# Altium footprint library PcbLib1.PcbLib: 212 footprints (part 8 of 14)
Each footprint in its own frame and in the unit in brackets; x right, y up, seen from the top. Pads: shape width x height; smd on the part's side, far side on the other; paste and mask are expansions set on the pad; w line width, h text height; cw(c..) or ccw(c..) is an arc to the next point about the centre after c.
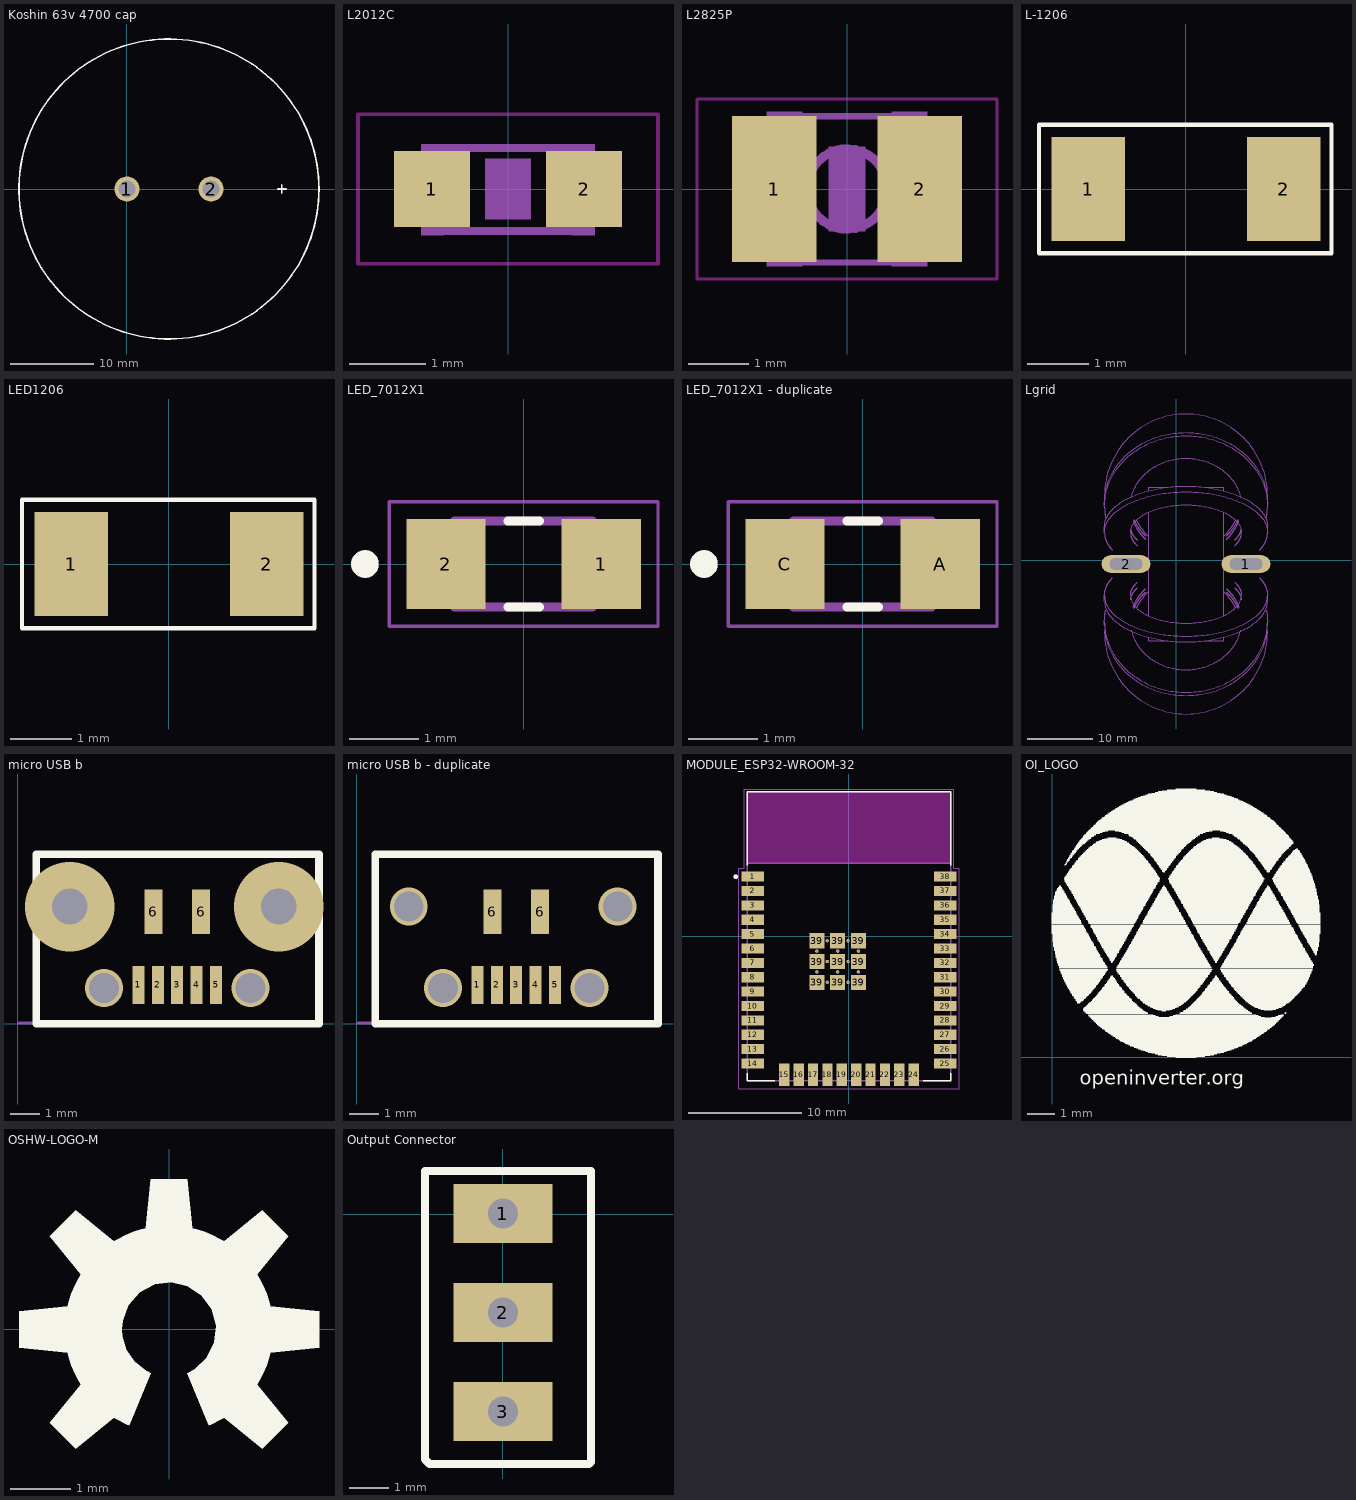
[diagram p7: the footprints below, top view; thin cyan lines are the x and y axes]

## Koshin 63v 4700 cap [mm]
pads (2):
  round 3 hole 2: 1(0,0) 2(10.1,0)
Top Overlay:
  circle w0.2: c5.05,0 r18
  lines w0.2: 18.082,0 19.098,0 ; 18.59,-0.508 18.59,0.508
3D body "Snap-Cap 35mm W x 50mm H 10mm pitch.step": height 50, standoff -6.2, extent -12.571,-17.421 22.425,17.575

## L2012C [mm] "L2012C"
pads (2):
  rect 1x1 smd: 1(-1,0) 2(1,0)
Top Layer keep-out:
  lines w0.051: -1.973,-0.983 -1.973,0.983 1.973,0.983 1.973,-0.983 -1.973,-0.983
Bottom Assembly:
  region: 0.838,-0.61 0.838,0.59 1.138,0.59 1.138,-0.61
  region: -1.143,-0.61 -1.143,0.59 -0.843,0.59 -0.843,-0.61
  lines w0.102: -0.864,-0.553 0.864,-0.553 ; -0.864,0.54 0.864,0.54
Top Glue Points:
  region: -0.3,-0.4 -0.3,0.4 0.3,0.4 0.3,-0.4

## L2825P [mm] "L2825P"
pads (2):
  rect 1.4x2.4 smd: 1(-1.2,0) 2(1.2,0)
Top Layer keep-out:
  lines w0.051: -2.473,-1.483 -2.473,1.483 2.473,1.483 2.473,-1.483 -2.473,-1.483
Bottom Assembly:
  circle w0.152: c0,0 r0.66
  region: -1.321,-1.27 -1.321,1.27 -0.737,1.27 -0.737,-1.27
  region: 0.737,-1.27 0.737,1.27 1.321,1.27 1.321,-1.27
  lines w0.102: -1.34,-0.965 -1.34,0.965 ; -0.762,-1.213 0.762,-1.213 ; -0.762,1.2 0.762,1.2 ; 1.34,-0.965 1.34,0.965
Top Glue Points:
  region: -0.3,-0.7 -0.3,0.7 0.3,0.7 0.3,-0.7

## L-1206 [mm]
pads (2):
  rect 1.2x1.7 smd: 1(-1.6,0) 2(1.6,0)
Top Overlay:
  lines w0.07: -2.4,-1.05 2.375,-1.05 2.375,-0.531 2.375,0.556 2.375,0.692 2.375,1.05 -2.4,1.05 -2.4,-1.05
3D body "SML-LXLC1206.stp": height 1.11, standoff 0, extent -1.73,-0.8 1.476,0.8

## LED1206 [mm]
pads (2):
  rect 1.2x1.7 smd: 1(-1.6,0) 2(1.6,0)
Top Overlay:
  lines w0.07: -2.4,-1.05 -2.4,1.05 2.375,1.05 2.375,0.692 2.375,0.556 2.375,-0.531 2.375,-1.05 -2.4,-1.05
3D body "SML-LXLC1206.stp": height 1.11, standoff 0, extent -1.73,-0.8 1.476,0.8

## LED_7012X1 [mm]
pads (2):
  rect 1.15x1.3 smd: 1(1.125,0) 2(-1.125,0)
Top Overlay:
  circle w0.2: c-2.3,0 r0.1
  lines w0.127: -0.23,-0.625 0.23,-0.625 ; -0.23,0.625 0.23,0.625
Mechanical 13:
  circle w0.2: c-2.3,0 r0.1
  lines w0.127: -1,-0.625 -1,0.625 1,0.625 1,-0.625 -1,-0.625
Mechanical 15:
  lines w0.05: -1.95,-0.9 -1.95,0.9 1.95,0.9 1.95,-0.9 -1.95,-0.9
3D body "7012X1--3DModel-STEP-1.STEP": height 0.73, standoff 0, extent -1.003,-0.622 1.003,0.622

## LED_7012X1 - duplicate [mm]
pads (2):
  rect 1.15x1.3 smd: A(1.125,0) C(-1.125,0)
Top Overlay:
  circle w0.2: c-2.3,0 r0.1
  lines w0.127: -0.23,-0.625 0.23,-0.625 ; -0.23,0.625 0.23,0.625
Mechanical 13:
  circle w0.2: c-2.3,0 r0.1
  lines w0.127: -1,-0.625 1,-0.625 1,0.625 -1,0.625 -1,-0.625
Mechanical 15:
  lines w0.05: -1.95,-0.9 1.95,-0.9 1.95,0.9 -1.95,0.9 -1.95,-0.9
3D body "7012X1--3DModel-STEP-1.STEP": height 0.73, standoff 0, extent -1.003,-0.622 1.003,0.622

## Lgrid [mm]
pads (2):
  oval 7.5x2.7 hole 1.8 slot 5 at 0 deg: 1(10.687,-0.59) 2(-7.713,-0.59)
Bottom Assembly:
  drawing of 3628 lines, arcs and shapes, not listed
3D body "750343811.stp": height 48.01, standoff 0.01, extent -11.28,-23.59 13.72,22.41

## micro USB b [mm]
pads (7):
  rect 0.4x1.27 smd: 1(4.05,1.3) 2(4.7,1.3) 3(5.35,1.3) 4(6,1.3) 5(6.65,1.3)
  rect 0.6x1.5 smd: 6(4.55,3.75) 6(6.15,3.75)
via 8.75,3.925 diameter 3 hole 1.2
via 1.75,3.925 diameter 3 hole 1.2
via 7.8,1.2 diameter 1.27 hole 1
via 2.9,1.2 diameter 1.27 hole 1
Top Overlay:
  lines w0.254: 0.625,0 10.1,0 10.1,5.675 0.625,5.675 0.625,0
Mechanical 15:
  lines w0.1: 0.05,0.025 10.1,0.025
3D body "zx62rd-ab-5p8.stp": height 2.74, standoff -0.64, extent 1.025,1.09 9.675,6.988

## micro USB b - duplicate [mm]
pads (7):
  rect 0.4x1.27 smd: 1(4.05,1.3) 2(4.7,1.3) 3(5.35,1.3) 4(6,1.3) 5(6.65,1.3)
  rect 0.6x1.5 smd: 6(4.55,3.75) 6(6.15,3.75)
via 8.75,3.925 diameter 1.27 hole 1
via 1.75,3.925 diameter 1.27 hole 1
via 7.8,1.2 diameter 1.27 hole 1
via 2.9,1.2 diameter 1.27 hole 1
Top Overlay:
  lines w0.254: 0.625,0 10.1,0 10.1,5.675 0.625,5.675 0.625,0
Mechanical 15:
  lines w0.1: 0.05,0.025 10.1,0.025

## MODULE_ESP32-WROOM-32 [mm]
pads (59):
  rect 2x0.9 smd: 1(-8.5,5.26) 2(-8.5,3.99) 3(-8.5,2.72) 4(-8.5,1.45) 5(-8.5,0.18) 6(-8.5,-1.09) 7(-8.5,-2.36) 8(-8.5,-3.63) 9(-8.5,-4.9) 10(-8.5,-6.17) 11(-8.5,-7.44) 12(-8.5,-8.71) 13(-8.5,-9.98) 14(-8.5,-11.25) 25(8.5,-11.25) 26(8.5,-9.98) 27(8.5,-8.71) 28(8.5,-7.44) 29(8.5,-6.17) 30(8.5,-4.9) 31(8.5,-3.63) 32(8.5,-2.36) 33(8.5,-1.09) 34(8.5,0.18) 35(8.5,1.45) 36(8.5,2.72) 37(8.5,3.99) 38(8.5,5.26)
  rect 0.9x2 smd: 15(-5.715,-12.25) 16(-4.445,-12.25) 17(-3.175,-12.25) 18(-1.905,-12.25) 19(-0.635,-12.25) 20(0.635,-12.25) 21(1.905,-12.25) 22(3.175,-12.25) 23(4.445,-12.25) 24(5.715,-12.25)
  rect 1.33x1.33 smd: 39(-2.835,-4.075) 39(-2.835,-2.24) 39(-2.835,-0.405) 39(-1,-4.075) 39(-1,-2.24) 39(-1,-0.405) 39(0.835,-4.075) 39(0.835,-2.24) 39(0.835,-0.405)
  round 0.3 hole 0.2: 39(-2.835,-3.157) 39(-2.835,-1.322) 39(-1.917,-4.075) 39(-1.917,-2.24) 39(-1.917,-0.405) 39(-1,-3.157) 39(-1,-1.322) 39(-0.082,-4.075) 39(-0.082,-2.24) 39(-0.082,-0.405) 39(0.835,-3.157) 39(0.835,-1.322)
Top Overlay:
  circle w0.2: c-10,5.25 r0.1
  lines w0.127: -9,-12.1 -9,-12.75 -6.55,-12.75 ; -9,6.25 -9,12.75 9,12.75 9,6.25 ; 6.55,-12.75 9,-12.75 9,-12.1
Keep-Out Layer:
  region: 9,6.45 -9,6.45 -9,12.75 9,12.75
  region: 9,6.45 -9,6.45 -9,12.75 9,12.75
Mechanical 13:
  circle w0.2: c-10,5.25 r0.1
  lines w0.127: -9,6.45 9,6.45 ; -9,6.45 -9,12.75 9,12.75 9,6.45 ; -9,6.45 -9,-12.75 9,-12.75 9,6.45
  text "ANTENNA" at -6,9 h1.78
Mechanical 15:
  lines w0.05: -9.75,-13.5 -9.75,6 -9.25,6 -9.25,13 9.25,13 9.25,6 9.75,6 9.75,-13.5 -9.75,-13.5
3D body "User Library-esp-wroom-32.STEP": height 3.05, standoff 0.01, extent -9.053,-12.77 9.017,12.77

## OI_LOGO [mm] "OI_LOGO"
Top Overlay:
  drawing of 1208 lines, arcs and shapes, not listed
  text "openinverter.org" at 1,-1 h0.52

## OSHW-LOGO-M [mm] "OSHW-LOGO-M"
Top Overlay:
  region: 0.658,-1.588 0.691,-1.574 0.755,-1.544 0.819,-1.512 0.881,-1.477 0.911,-1.458 1.539,-1.97 1.97,-1.539 1.458,-0.911 1.495,-0.85 1.561,-0.724 1.615,-0.592 1.659,-0.456 1.675,-0.387 2.481,-0.305 2.481,0.305 1.675,0.387 1.659,0.456 1.615,0.592 1.561,0.724 1.495,0.85 1.458,0.911 1.97,1.539 1.539,1.97 0.911,1.458 0.85,1.495 0.724,1.561 0.592,1.615 0.456,1.659 0.387,1.675 0.305,2.481 -0.305,2.481 -0.387,1.675 -0.456,1.659 -0.592,1.615 -0.724,1.561 -0.85,1.495 -0.911,1.458 -1.539,1.97 -1.97,1.539 -1.458,0.911 -1.495,0.85 -1.561,0.724 -1.615,0.592 -1.659,0.456 -1.675,0.387 -2.481,0.305 -2.481,-0.305 -1.675,-0.387 -1.659,-0.456 -1.615,-0.592 -1.561,-0.724 -1.495,-0.85 -1.458,-0.911 -1.97,-1.539 -1.539,-1.97 -0.911,-1.458 -0.881,-1.477 -0.819,-1.512 -0.755,-1.544 -0.691,-1.574 -0.658,-1.588 -0.299,-0.722 -0.402,-0.67 -0.579,-0.525 -0.706,-0.334 -0.773,-0.115 -0.781,0 -0.769,0.14 -0.67,0.402 -0.486,0.612 -0.239,0.744 0.038,0.78 0.311,0.717 0.543,0.561 0.706,0.334 0.779,0.064 0.751,-0.215 0.628,-0.465 0.423,-0.657 0.299,-0.722

## Output Connector [mm]
pads (3):
  rect 2.5x1.5 hole 0.762 square: 1(0,0.025) 2(0,-2.475) 3(0,-4.975)
Top Overlay:
  lines w0.2: -1.965,-6.185 -1.965,1.1 2.225,1.1 2.225,-6.25 2.175,-6.3 0.45,-6.3 -1.85,-6.3 -1.965,-6.185
3D body "Pin Header 1x3 TH Pitch 2.54mm.stp": height 9.21, standoff -3.49, extent -1.27,-6.245 1.27,1.375

## PCBComponent_1 [mm]

## PCBComponent_1 - duplicate [mm]